# Altium schematic symbol library Regulator_Linear.SchLib: 1452 symbols (part 2 of 10) (continued)
## APE8865Y5-30-HF-3
designator *  value APE8865Y5-30-HF-3
ki_keywords: 300mA LDO Regulator Fixed Positive; ki_description: 300mA Low Dropout Voltage Regulator, Fixed Output 3.0V, SOT-23-5; ki_fp_filters: SOT?23*; Footprint: Package_TO_SOT_SMD:SOT-23-5; Supplier: http://www.tme.eu/fr/Document/ced3461ed31ea70a3c416fb648e0cde7/APE8865-3.pdf
footprint SOT-23-5
pins: 1 VIN (power), 2 GND (power), 3 ~{{SHDN}} (in), 4 BYP (in), 5 VOUT (power)

## APE8865Y5-31-HF-3
designator *  value APE8865Y5-31-HF-3
ki_keywords: 300mA LDO Regulator Fixed Positive; ki_description: 300mA Low Dropout Voltage Regulator, Fixed Output 3.1V, SOT-23-5; ki_fp_filters: SOT?23*; Footprint: Package_TO_SOT_SMD:SOT-23-5; Supplier: http://www.tme.eu/fr/Document/ced3461ed31ea70a3c416fb648e0cde7/APE8865-3.pdf
footprint SOT-23-5
pins: 1 VIN (power), 2 GND (power), 3 ~{{SHDN}} (in), 4 BYP (in), 5 VOUT (power)

## APE8865Y5-32-HF-3
designator *  value APE8865Y5-32-HF-3
ki_keywords: 300mA LDO Regulator Fixed Positive; ki_description: 300mA Low Dropout Voltage Regulator, Fixed Output 3.2V, SOT-23-5; ki_fp_filters: SOT?23*; Footprint: Package_TO_SOT_SMD:SOT-23-5; Supplier: http://www.tme.eu/fr/Document/ced3461ed31ea70a3c416fb648e0cde7/APE8865-3.pdf
footprint SOT-23-5
pins: 1 VIN (power), 2 GND (power), 3 ~{{SHDN}} (in), 4 BYP (in), 5 VOUT (power)

## APE8865Y5-33-HF-3
designator *  value APE8865Y5-33-HF-3
ki_keywords: 300mA LDO Regulator Fixed Positive; ki_description: 300mA Low Dropout Voltage Regulator, Fixed Output 3.3V, SOT-23-5; ki_fp_filters: SOT?23*; Footprint: Package_TO_SOT_SMD:SOT-23-5; Supplier: http://www.tme.eu/fr/Document/ced3461ed31ea70a3c416fb648e0cde7/APE8865-3.pdf
footprint SOT-23-5
pins: 1 VIN (power), 2 GND (power), 3 ~{{SHDN}} (in), 4 BYP (in), 5 VOUT (power)

## AZ1084-1.2
designator *  value AZ1084-1.2
ki_keywords: Fixed Voltage Regulator 5A Positive LDO; ki_description: 5A 12V Fixed LDO Linear Regulator, 1.2V, TO-220/TO-252/TO-263; ki_fp_filters: TO?220* TO?252* TO?263*; Supplier: https://www.diodes.com/assets/Datasheets/AZ1084.pdf
pins: 1 GND (power), 2 VO (power), 3 VI (power)

## AZ1084-1.5
designator *  value AZ1084-1.5
ki_keywords: Fixed Voltage Regulator 5A Positive LDO; ki_description: 5A 12V Fixed LDO Linear Regulator, 1.5V, TO-220/TO-252/TO-263; ki_fp_filters: TO?220* TO?252* TO?263*; Supplier: https://www.diodes.com/assets/Datasheets/AZ1084.pdf
pins: 1 GND (power), 2 VO (power), 3 VI (power)

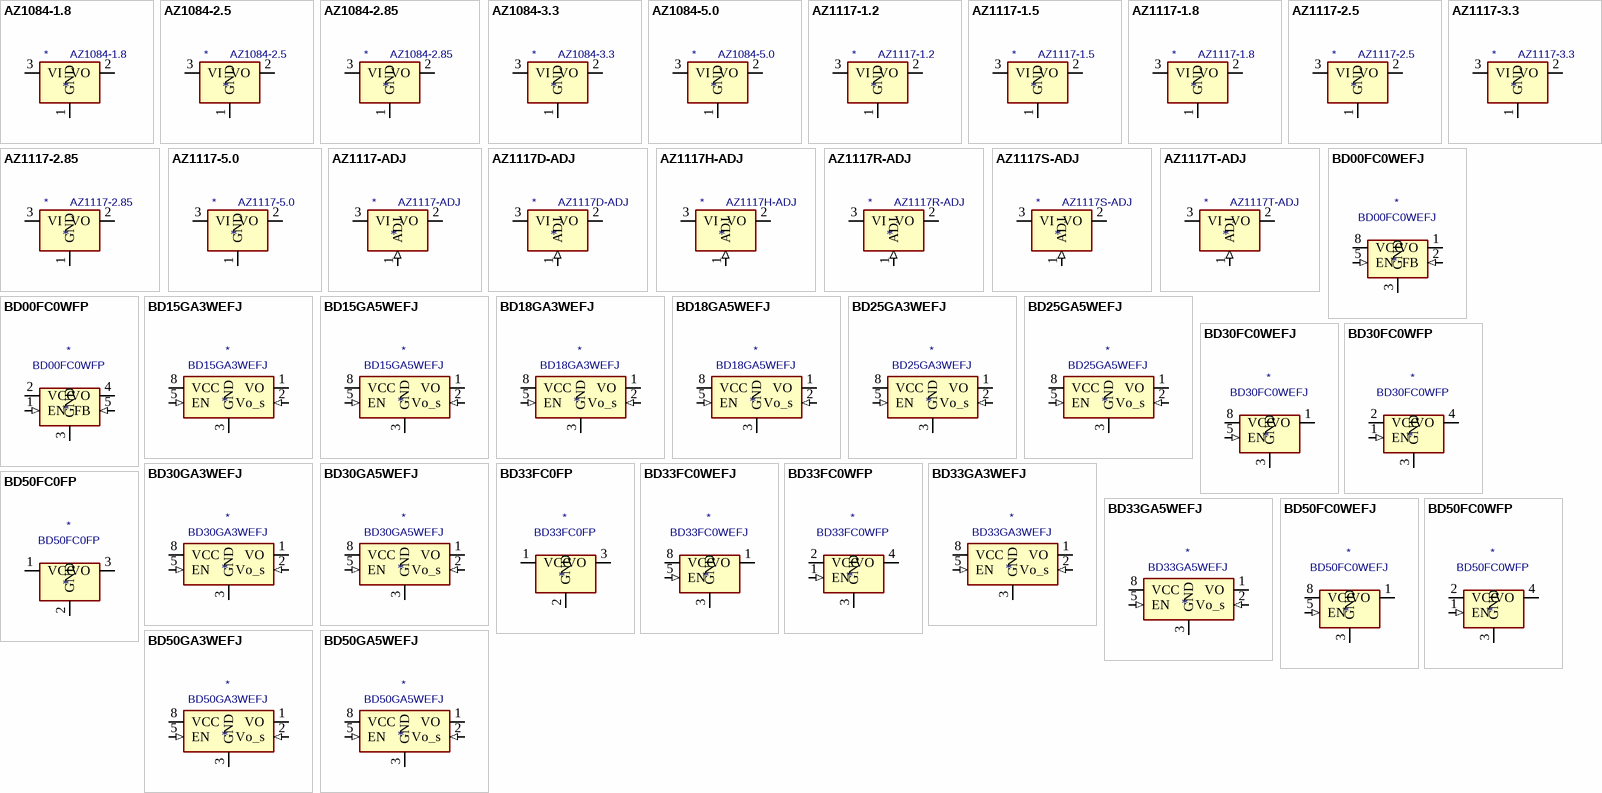
[diagram p6: symbols AZ1084-1.8 to BD50GA5WEFJ]

## AZ1084-1.8
designator *  value AZ1084-1.8
ki_keywords: Fixed Voltage Regulator 5A Positive LDO; ki_description: 5A 12V Fixed LDO Linear Regulator, 1.5V, TO-220/TO-252/TO-263; ki_fp_filters: TO?220* TO?252* TO?263*; Supplier: https://www.diodes.com/assets/Datasheets/AZ1084.pdf
pins: 1 GND (power), 2 VO (power), 3 VI (power)

## AZ1084-2.5
designator *  value AZ1084-2.5
ki_keywords: Fixed Voltage Regulator 5A Positive LDO; ki_description: 5A 12V Fixed LDO Linear Regulator, 1.5V, TO-220/TO-252/TO-263; ki_fp_filters: TO?220* TO?252* TO?263*; Supplier: https://www.diodes.com/assets/Datasheets/AZ1084.pdf
pins: 1 GND (power), 2 VO (power), 3 VI (power)

## AZ1084-2.85
designator *  value AZ1084-2.85
ki_keywords: Fixed Voltage Regulator 5A Positive LDO; ki_description: 5A 12V Fixed LDO Linear Regulator, 1.5V, TO-220/TO-252/TO-263; ki_fp_filters: TO?220* TO?252* TO?263*; Supplier: https://www.diodes.com/assets/Datasheets/AZ1084.pdf
pins: 1 GND (power), 2 VO (power), 3 VI (power)

## AZ1084-3.3
designator *  value AZ1084-3.3
ki_keywords: Fixed Voltage Regulator 5A Positive LDO; ki_description: 5A 12V Fixed LDO Linear Regulator, 1.5V, TO-220/TO-252/TO-263; ki_fp_filters: TO?220* TO?252* TO?263*; Supplier: https://www.diodes.com/assets/Datasheets/AZ1084.pdf
pins: 1 GND (power), 2 VO (power), 3 VI (power)

## AZ1084-5.0
designator *  value AZ1084-5.0
ki_keywords: Fixed Voltage Regulator 5A Positive LDO; ki_description: 5A 12V Fixed LDO Linear Regulator, 1.5V, TO-220/TO-252/TO-263; ki_fp_filters: TO?220* TO?252* TO?263*; Supplier: https://www.diodes.com/assets/Datasheets/AZ1084.pdf
pins: 1 GND (power), 2 VO (power), 3 VI (power)

## AZ1117-1.2
designator *  value AZ1117-1.2
ki_keywords: Fixed Voltage Regulator 1A Positive LDO; ki_description: 1A 20V Fixed LDO Linear Regulator, 1.2V, SOT-89/SOT-223/TO-220/TO-252/TO-263; ki_fp_filters: SOT?223* SOT?89* TO?220* TO?252* TO?263*; Supplier: https://www.diodes.com/assets/Datasheets/AZ1117.pdf
pins: 1 GND (power), 2 VO (power), 3 VI (power)

## AZ1117-1.5
designator *  value AZ1117-1.5
ki_keywords: Fixed Voltage Regulator 1A Positive LDO; ki_description: 1A 20V Fixed LDO Linear Regulator, 1.5V, SOT-89/SOT-223/TO-220/TO-252/TO-263; ki_fp_filters: SOT?223* SOT?89* TO?220* TO?252* TO?263*; Supplier: https://www.diodes.com/assets/Datasheets/AZ1117.pdf
pins: 1 GND (power), 2 VO (power), 3 VI (power)

## AZ1117-1.8
designator *  value AZ1117-1.8
ki_keywords: Fixed Voltage Regulator 1A Positive LDO; ki_description: 1A 20V Fixed LDO Linear Regulator, 1.8V, SOT-89/SOT-223/TO-220/TO-252/TO-263; ki_fp_filters: SOT?223* SOT?89* TO?220* TO?252* TO?263*; Supplier: https://www.diodes.com/assets/Datasheets/AZ1117.pdf
pins: 1 GND (power), 2 VO (power), 3 VI (power)

## AZ1117-2.5
designator *  value AZ1117-2.5
ki_keywords: Fixed Voltage Regulator 1A Positive LDO; ki_description: 1A 20V Fixed LDO Linear Regulator, 2.5V, SOT-89/SOT-223/TO-220/TO-252/TO-263; ki_fp_filters: SOT?223* SOT?89* TO?220* TO?252* TO?263*; Supplier: https://www.diodes.com/assets/Datasheets/AZ1117.pdf
pins: 1 GND (power), 2 VO (power), 3 VI (power)

## AZ1117-2.85
designator *  value AZ1117-2.85
ki_keywords: Fixed Voltage Regulator 1A Positive LDO; ki_description: 1A 20V Fixed LDO Linear Regulator, 2.85V, SOT-89/SOT-223/TO-220/TO-252/TO-263; ki_fp_filters: SOT?223* SOT?89* TO?220* TO?252* TO?263*; Supplier: https://www.diodes.com/assets/Datasheets/AZ1117.pdf
pins: 1 GND (power), 2 VO (power), 3 VI (power)

## AZ1117-3.3
designator *  value AZ1117-3.3
ki_keywords: Fixed Voltage Regulator 1A Positive LDO; ki_description: 1A 20V Fixed LDO Linear Regulator, 3.3V, SOT-89/SOT-223/TO-220/TO-252/TO-263; ki_fp_filters: SOT?223* SOT?89* TO?220* TO?252* TO?263*; Supplier: https://www.diodes.com/assets/Datasheets/AZ1117.pdf
pins: 1 GND (power), 2 VO (power), 3 VI (power)

## AZ1117-5.0
designator *  value AZ1117-5.0
ki_keywords: Fixed Voltage Regulator 1A Positive LDO; ki_description: 1A 20V Fixed LDO Linear Regulator, 5.0V, SOT-89/SOT-223/TO-220/TO-252/TO-263; ki_fp_filters: SOT?223* SOT?89* TO?220* TO?252* TO?263*; Supplier: https://www.diodes.com/assets/Datasheets/AZ1117.pdf
pins: 1 GND (power), 2 VO (power), 3 VI (power)

## AZ1117-ADJ
designator *  value AZ1117-ADJ
ki_keywords: Adjustable Voltage Regulator 1A Positive LDO; ki_description: 1A 20V Adjustable LDO Linear Regulator, SOT-89/SOT-223/TO-220/TO-252/TO-263; ki_fp_filters: SOT?223* SOT?89* TO?220* TO?252* TO?263*; Supplier: https://www.diodes.com/assets/Datasheets/AZ1117.pdf
pins: 1 ADJ (in), 2 VO (power), 3 VI (power)

## AZ1117D-ADJ
designator *  value AZ1117D-ADJ
ki_keywords: Adjustable Voltage Regulator 1A Positive LDO; ki_description: 1A 20V Adjustable LDO Linear Regulator, TO-252; ki_fp_filters: TO?252*; Footprint: Package_TO_SOT_SMD:TO-252-2; Supplier: https://www.diodes.com/assets/Datasheets/products_inactive_data/AZ1117.pdf
footprint TO-252-2
pins: 1 ADJ (in), 2 VO (power), 3 VI (power)

## AZ1117H-ADJ
designator *  value AZ1117H-ADJ
ki_keywords: Adjustable Voltage Regulator 1A Positive LDO; ki_description: 1A 20V Adjustable LDO Linear Regulator, SOT-223; ki_fp_filters: SOT?223*TabPin2*; Footprint: Package_TO_SOT_SMD:SOT-223-3_TabPin2; Supplier: https://www.diodes.com/assets/Datasheets/products_inactive_data/AZ1117.pdf
footprint SOT-223-3_TabPin2
pins: 1 ADJ (in), 2 VO (power), 3 VI (power)

## AZ1117R-ADJ
designator *  value AZ1117R-ADJ
ki_keywords: Adjustable Voltage Regulator 1A Positive LDO; ki_description: 1A 20V Adjustable LDO Linear Regulator, SOT-89; ki_fp_filters: SOT?89*; Footprint: Package_TO_SOT_SMD:SOT-89-3; Supplier: https://www.diodes.com/assets/Datasheets/products_inactive_data/AZ1117.pdf
footprint SOT-89-3
pins: 1 ADJ (in), 2 VO (power), 3 VI (power)

## AZ1117S-ADJ
designator *  value AZ1117S-ADJ
ki_keywords: Adjustable Voltage Regulator 1A Positive LDO; ki_description: 1A 20V Adjustable LDO Linear Regulator, TO-263; ki_fp_filters: TO?263*; Footprint: Package_TO_SOT_SMD:TO-263-2; Supplier: https://www.diodes.com/assets/Datasheets/products_inactive_data/AZ1117.pdf
footprint TO-263-2
pins: 1 ADJ (in), 2 VO (power), 3 VI (power)

## AZ1117T-ADJ
designator *  value AZ1117T-ADJ
ki_keywords: Adjustable Voltage Regulator 1A Positive LDO; ki_description: 1A 20V Adjustable LDO Linear Regulator, TO-220; ki_fp_filters: TO?220*; Footprint: Package_TO_SOT_THT:TO-220-3_Vertical; Supplier: https://www.diodes.com/assets/Datasheets/products_inactive_data/AZ1117.pdf
footprint TO-220-3_Vertical
pins: 1 ADJ (in), 2 VO (power), 3 VI (power)

## BD00FC0WEFJ
designator *  value BD00FC0WEFJ
ki_keywords: linear regulator variable positive over voltage protection thermal shutdown; ki_description: 1A, variable LDO regulator with OVP & TSP, with enable, HTSOP-J8; ki_fp_filters: HTSOP*1EP*3.9x4.9mm*P1.27mm*; Footprint: Package_SO:HTSOP-8-1EP_3.9x4.9mm_P1.27mm_EP2.4x3.2mm; Supplier: https://fscdn.rohm.com/en/products/databook/datasheet/ic/power/linear_regulator/bdxxfc0wefj-e.pdf
footprint HTSOP-8-1EP_3.9x4.9mm_P1.27mm_EP2.4x3.2mm
pins: 1 VO (power), 2 FB (in), 3 GND (power), 4 NC (in) hidden, 5 EN (in), 6 NC (in) hidden, 7 NC (in) hidden, 8 VCC (power), 9 GND hidden

## BD00FC0WFP
designator *  value BD00FC0WFP
ki_keywords: linear regulator variable positive over voltage protection thermal shutdown; ki_description: 1A, variable LDO regulator with OVP & TSP, with enable, TO-252; ki_fp_filters: TO?252*; Footprint: Package_TO_SOT_SMD:TO-252-4; Supplier: https://fscdn.rohm.com/en/products/databook/datasheet/ic/power/linear_regulator/bdxxfc0wefj-e.pdf
footprint TO-252-4
pins: 1 EN (in), 2 VCC (power), 3 GND (power), 4 VO (power), 5 FB (in)

## BD15GA3WEFJ
designator *  value BD15GA3WEFJ
ki_keywords: linear regulator fixed positive over voltage protection thermal shutdown; ki_description: 300mA, 1.5V LDO regulator with OVP & TSP, HTSOP-8; ki_fp_filters: HTSOP*1EP*3.9x4.9mm*P1.27mm*; Footprint: Package_SO:HTSOP-8-1EP_3.9x4.9mm_P1.27mm_EP2.4x3.2mm; Supplier: http://rohmfs.rohm.com/en/products/databook/datasheet/ic/power/linear_regulator/bdxxga3wefj-e.pdf
footprint HTSOP-8-1EP_3.9x4.9mm_P1.27mm_EP2.4x3.2mm
pins: 1 VO (power), 2 Vo_s (in), 3 GND (power), 4 GND hidden, 5 EN (in), 6 GND hidden, 7 GND hidden, 8 VCC (power), 9 GND hidden

## BD15GA5WEFJ
designator *  value BD15GA5WEFJ
ki_keywords: linear regulator fixed positive over voltage protection thermal shutdown; ki_description: 500mA, 1.5V LDO regulator with OVP & TSP, HTSOP-8; ki_fp_filters: HTSOP*1EP*3.9x4.9mm*P1.27mm*; Footprint: Package_SO:HTSOP-8-1EP_3.9x4.9mm_P1.27mm_EP2.4x3.2mm; Supplier: http://rohmfs.rohm.com/en/products/databook/datasheet/ic/power/linear_regulator/bdxxga5wefj-e.pdf
footprint HTSOP-8-1EP_3.9x4.9mm_P1.27mm_EP2.4x3.2mm
pins: 1 VO (power), 2 Vo_s (in), 3 GND (power), 4 GND hidden, 5 EN (in), 6 GND hidden, 7 GND hidden, 8 VCC (power), 9 GND hidden

## BD18GA3WEFJ
designator *  value BD18GA3WEFJ
ki_keywords: linear regulator fixed positive over voltage protection thermal shutdown; ki_description: 300mA, 1.8V LDO regulator with OVP & TSP, HTSOP-8; ki_fp_filters: HTSOP*1EP*3.9x4.9mm*P1.27mm*; Footprint: Package_SO:HTSOP-8-1EP_3.9x4.9mm_P1.27mm_EP2.4x3.2mm; Supplier: http://rohmfs.rohm.com/en/products/databook/datasheet/ic/power/linear_regulator/bdxxga3wefj-e.pdf
footprint HTSOP-8-1EP_3.9x4.9mm_P1.27mm_EP2.4x3.2mm
pins: 1 VO (power), 2 Vo_s (in), 3 GND (power), 4 GND hidden, 5 EN (in), 6 GND hidden, 7 GND hidden, 8 VCC (power), 9 GND hidden

## BD18GA5WEFJ
designator *  value BD18GA5WEFJ
ki_keywords: linear regulator fixed positive over voltage protection thermal shutdown; ki_description: 500mA, 1.8V LDO regulator with OVP & TSP, HTSOP-8; ki_fp_filters: HTSOP*1EP*3.9x4.9mm*P1.27mm*; Footprint: Package_SO:HTSOP-8-1EP_3.9x4.9mm_P1.27mm_EP2.4x3.2mm; Supplier: http://rohmfs.rohm.com/en/products/databook/datasheet/ic/power/linear_regulator/bdxxga5wefj-e.pdf
footprint HTSOP-8-1EP_3.9x4.9mm_P1.27mm_EP2.4x3.2mm
pins: 1 VO (power), 2 Vo_s (in), 3 GND (power), 4 GND hidden, 5 EN (in), 6 GND hidden, 7 GND hidden, 8 VCC (power), 9 GND hidden

## BD25GA3WEFJ
designator *  value BD25GA3WEFJ
ki_keywords: linear regulator fixed positive over voltage protection thermal shutdown; ki_description: 300mA, 2.5V LDO regulator with OVP & TSP, HTSOP-8; ki_fp_filters: HTSOP*1EP*3.9x4.9mm*P1.27mm*; Footprint: Package_SO:HTSOP-8-1EP_3.9x4.9mm_P1.27mm_EP2.4x3.2mm; Supplier: http://rohmfs.rohm.com/en/products/databook/datasheet/ic/power/linear_regulator/bdxxga3wefj-e.pdf
footprint HTSOP-8-1EP_3.9x4.9mm_P1.27mm_EP2.4x3.2mm
pins: 1 VO (power), 2 Vo_s (in), 3 GND (power), 4 GND hidden, 5 EN (in), 6 GND hidden, 7 GND hidden, 8 VCC (power), 9 GND hidden

## BD25GA5WEFJ
designator *  value BD25GA5WEFJ
ki_keywords: linear regulator fixed positive over voltage protection thermal shutdown; ki_description: 500mA, 2.5V LDO regulator with OVP & TSP, HTSOP-8; ki_fp_filters: HTSOP*1EP*3.9x4.9mm*P1.27mm*; Footprint: Package_SO:HTSOP-8-1EP_3.9x4.9mm_P1.27mm_EP2.4x3.2mm; Supplier: http://rohmfs.rohm.com/en/products/databook/datasheet/ic/power/linear_regulator/bdxxga5wefj-e.pdf
footprint HTSOP-8-1EP_3.9x4.9mm_P1.27mm_EP2.4x3.2mm
pins: 1 VO (power), 2 Vo_s (in), 3 GND (power), 4 GND hidden, 5 EN (in), 6 GND hidden, 7 GND hidden, 8 VCC (power), 9 GND hidden

## BD30FC0WEFJ
designator *  value BD30FC0WEFJ
ki_keywords: linear regulator fixed positive over voltage protection thermal shutdown; ki_description: 1A, 3.0V LDO regulator with OVP & TSP, with enable, HTSOP-J8; ki_fp_filters: HTSOP*1EP*3.9x4.9mm*P1.27mm*; Footprint: Package_SO:HTSOP-8-1EP_3.9x4.9mm_P1.27mm_EP2.4x3.2mm; Supplier: https://fscdn.rohm.com/en/products/databook/datasheet/ic/power/linear_regulator/bdxxfc0wefj-e.pdf
footprint HTSOP-8-1EP_3.9x4.9mm_P1.27mm_EP2.4x3.2mm
pins: 1 VO (power), 2 NC (in) hidden, 3 GND (power), 4 NC (in) hidden, 5 EN (in), 6 NC (in) hidden, 7 NC (in) hidden, 8 VCC (power), 9 GND hidden

## BD30FC0WFP
designator *  value BD30FC0WFP
ki_keywords: linear regulator fixed positive over voltage protection thermal shutdown; ki_description: 1A, 3.0V LDO regulator with OVP & TSP, with enable, TO-252; ki_fp_filters: TO?252*; Footprint: Package_TO_SOT_SMD:TO-252-4; Supplier: https://fscdn.rohm.com/en/products/databook/datasheet/ic/power/linear_regulator/bdxxfc0wefj-e.pdf
footprint TO-252-4
pins: 1 EN (in), 2 VCC (power), 3 GND (power), 4 VO (power), 5 NC (in) hidden

## BD30GA3WEFJ
designator *  value BD30GA3WEFJ
ki_keywords: linear regulator fixed positive over voltage protection thermal shutdown; ki_description: 300mA, 3V LDO regulator with OVP & TSP, HTSOP-8; ki_fp_filters: HTSOP*1EP*3.9x4.9mm*P1.27mm*; Footprint: Package_SO:HTSOP-8-1EP_3.9x4.9mm_P1.27mm_EP2.4x3.2mm; Supplier: http://rohmfs.rohm.com/en/products/databook/datasheet/ic/power/linear_regulator/bdxxga3wefj-e.pdf
footprint HTSOP-8-1EP_3.9x4.9mm_P1.27mm_EP2.4x3.2mm
pins: 1 VO (power), 2 Vo_s (in), 3 GND (power), 4 GND hidden, 5 EN (in), 6 GND hidden, 7 GND hidden, 8 VCC (power), 9 GND hidden

## BD30GA5WEFJ
designator *  value BD30GA5WEFJ
ki_keywords: linear regulator fixed positive over voltage protection thermal shutdown; ki_description: 500mA, 3V LDO regulator with OVP & TSP, HTSOP-8; ki_fp_filters: HTSOP*1EP*3.9x4.9mm*P1.27mm*; Footprint: Package_SO:HTSOP-8-1EP_3.9x4.9mm_P1.27mm_EP2.4x3.2mm; Supplier: http://rohmfs.rohm.com/en/products/databook/datasheet/ic/power/linear_regulator/bdxxga5wefj-e.pdf
footprint HTSOP-8-1EP_3.9x4.9mm_P1.27mm_EP2.4x3.2mm
pins: 1 VO (power), 2 Vo_s (in), 3 GND (power), 4 GND hidden, 5 EN (in), 6 GND hidden, 7 GND hidden, 8 VCC (power), 9 GND hidden

## BD33FC0FP
designator *  value BD33FC0FP
ki_keywords: linear regulator fixed positive over voltage protection thermal shutdown; ki_description: 1A, 3.3V LDO regulator with OVP & TSP, without enable, TO-252; ki_fp_filters: TO?252*; Footprint: Package_TO_SOT_SMD:TO-252-2; Supplier: https://fscdn.rohm.com/en/products/databook/datasheet/ic/power/linear_regulator/bdxxfc0wefj-e.pdf
footprint TO-252-2
pins: 1 VCC (power), 2 GND (power), 3 VO (power)

## BD33FC0WEFJ
designator *  value BD33FC0WEFJ
ki_keywords: linear regulator fixed positive over voltage protection thermal shutdown; ki_description: 1A, 3.3V LDO regulator with OVP & TSP, with enable, HTSOP-J8; ki_fp_filters: HTSOP*1EP*3.9x4.9mm*P1.27mm*; Footprint: Package_SO:HTSOP-8-1EP_3.9x4.9mm_P1.27mm_EP2.4x3.2mm; Supplier: https://fscdn.rohm.com/en/products/databook/datasheet/ic/power/linear_regulator/bdxxfc0wefj-e.pdf
footprint HTSOP-8-1EP_3.9x4.9mm_P1.27mm_EP2.4x3.2mm
pins: 1 VO (power), 2 NC (in) hidden, 3 GND (power), 4 NC (in) hidden, 5 EN (in), 6 NC (in) hidden, 7 NC (in) hidden, 8 VCC (power), 9 GND hidden

## BD33FC0WFP
designator *  value BD33FC0WFP
ki_keywords: linear regulator fixed positive over voltage protection thermal shutdown; ki_description: 1A, 3.3V LDO regulator with OVP & TSP, with enable, TO-252; ki_fp_filters: TO?252*; Footprint: Package_TO_SOT_SMD:TO-252-4; Supplier: https://fscdn.rohm.com/en/products/databook/datasheet/ic/power/linear_regulator/bdxxfc0wefj-e.pdf
footprint TO-252-4
pins: 1 EN (in), 2 VCC (power), 3 GND (power), 4 VO (power), 5 NC (in) hidden

## BD33GA3WEFJ
designator *  value BD33GA3WEFJ
ki_keywords: linear regulator fixed positive over voltage protection thermal shutdown; ki_description: 300mA, 3.3V LDO regulator with OVP & TSP, HTSOP-8; ki_fp_filters: HTSOP*1EP*3.9x4.9mm*P1.27mm*; Footprint: Package_SO:HTSOP-8-1EP_3.9x4.9mm_P1.27mm_EP2.4x3.2mm; Supplier: http://rohmfs.rohm.com/en/products/databook/datasheet/ic/power/linear_regulator/bdxxga3wefj-e.pdf
footprint HTSOP-8-1EP_3.9x4.9mm_P1.27mm_EP2.4x3.2mm
pins: 1 VO (power), 2 Vo_s (in), 3 GND (power), 4 GND hidden, 5 EN (in), 6 GND hidden, 7 GND hidden, 8 VCC (power), 9 GND hidden

## BD33GA5WEFJ
designator *  value BD33GA5WEFJ
ki_keywords: linear regulator fixed positive over voltage protection thermal shutdown; ki_description: 500mA, 3.3V LDO regulator with OVP & TSP, HTSOP-8; ki_fp_filters: HTSOP*1EP*3.9x4.9mm*P1.27mm*; Footprint: Package_SO:HTSOP-8-1EP_3.9x4.9mm_P1.27mm_EP2.4x3.2mm; Supplier: http://rohmfs.rohm.com/en/products/databook/datasheet/ic/power/linear_regulator/bdxxga5wefj-e.pdf
footprint HTSOP-8-1EP_3.9x4.9mm_P1.27mm_EP2.4x3.2mm
pins: 1 VO (power), 2 Vo_s (in), 3 GND (power), 4 GND hidden, 5 EN (in), 6 GND hidden, 7 GND hidden, 8 VCC (power), 9 GND hidden

## BD50FC0FP
designator *  value BD50FC0FP
ki_keywords: linear regulator fixed positive over voltage protection thermal shutdown; ki_description: 1A, 5.0V LDO regulator with OVP & TSP, without enable, TO-252; ki_fp_filters: TO?252*; Footprint: Package_TO_SOT_SMD:TO-252-2; Supplier: https://fscdn.rohm.com/en/products/databook/datasheet/ic/power/linear_regulator/bdxxfc0wefj-e.pdf
footprint TO-252-2
pins: 1 VCC (power), 2 GND (power), 3 VO (power)

## BD50FC0WEFJ
designator *  value BD50FC0WEFJ
ki_keywords: linear regulator fixed positive over voltage protection thermal shutdown; ki_description: 1A, 5.0V LDO regulator with OVP & TSP, with enable, HTSOP-J8; ki_fp_filters: HTSOP*1EP*3.9x4.9mm*P1.27mm*; Footprint: Package_SO:HTSOP-8-1EP_3.9x4.9mm_P1.27mm_EP2.4x3.2mm; Supplier: https://fscdn.rohm.com/en/products/databook/datasheet/ic/power/linear_regulator/bdxxfc0wefj-e.pdf
footprint HTSOP-8-1EP_3.9x4.9mm_P1.27mm_EP2.4x3.2mm
pins: 1 VO (power), 2 NC (in) hidden, 3 GND (power), 4 NC (in) hidden, 5 EN (in), 6 NC (in) hidden, 7 NC (in) hidden, 8 VCC (power), 9 GND hidden

## BD50FC0WFP
designator *  value BD50FC0WFP
ki_keywords: linear regulator fixed positive over voltage protection thermal shutdown; ki_description: 1A, 5.0V LDO regulator with OVP & TSP, with enable, TO-252; ki_fp_filters: TO?252*; Footprint: Package_TO_SOT_SMD:TO-252-4; Supplier: https://fscdn.rohm.com/en/products/databook/datasheet/ic/power/linear_regulator/bdxxfc0wefj-e.pdf
footprint TO-252-4
pins: 1 EN (in), 2 VCC (power), 3 GND (power), 4 VO (power), 5 NC (in) hidden

## BD50GA3WEFJ
designator *  value BD50GA3WEFJ
ki_keywords: linear regulator fixed positive over voltage protection thermal shutdown; ki_description: 300mA, 5V LDO regulator with OVP & TSP, HTSOP-8; ki_fp_filters: HTSOP*1EP*3.9x4.9mm*P1.27mm*; Footprint: Package_SO:HTSOP-8-1EP_3.9x4.9mm_P1.27mm_EP2.4x3.2mm; Supplier: http://rohmfs.rohm.com/en/products/databook/datasheet/ic/power/linear_regulator/bdxxga3wefj-e.pdf
footprint HTSOP-8-1EP_3.9x4.9mm_P1.27mm_EP2.4x3.2mm
pins: 1 VO (power), 2 Vo_s (in), 3 GND (power), 4 GND hidden, 5 EN (in), 6 GND hidden, 7 GND hidden, 8 VCC (power), 9 GND hidden

## BD50GA5WEFJ
designator *  value BD50GA5WEFJ
ki_keywords: linear regulator fixed positive over voltage protection thermal shutdown; ki_description: 500mA, 5V LDO regulator with OVP & TSP, HTSOP-8; ki_fp_filters: HTSOP*1EP*3.9x4.9mm*P1.27mm*; Footprint: Package_SO:HTSOP-8-1EP_3.9x4.9mm_P1.27mm_EP2.4x3.2mm; Supplier: http://rohmfs.rohm.com/en/products/databook/datasheet/ic/power/linear_regulator/bdxxga5wefj-e.pdf
footprint HTSOP-8-1EP_3.9x4.9mm_P1.27mm_EP2.4x3.2mm
pins: 1 VO (power), 2 Vo_s (in), 3 GND (power), 4 GND hidden, 5 EN (in), 6 GND hidden, 7 GND hidden, 8 VCC (power), 9 GND hidden

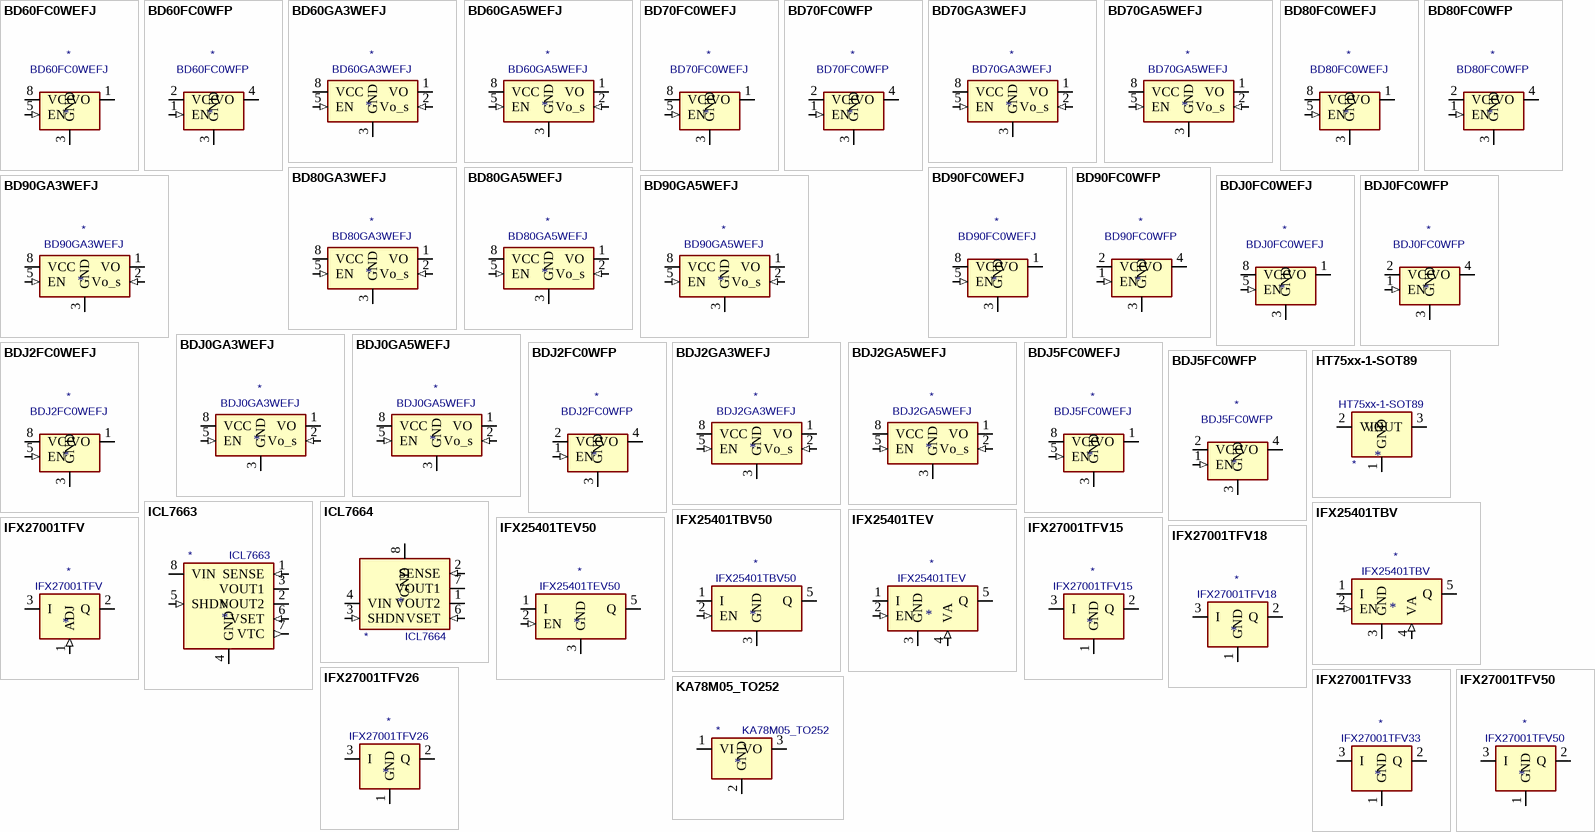
[diagram p7: symbols BD60FC0WEFJ to KA78M05_TO252]

## BD60FC0WEFJ
designator *  value BD60FC0WEFJ
ki_keywords: linear regulator fixed positive over voltage protection thermal shutdown; ki_description: 1A, 6.0V LDO regulator with OVP & TSP, with enable, HTSOP-J8; ki_fp_filters: HTSOP*1EP*3.9x4.9mm*P1.27mm*; Footprint: Package_SO:HTSOP-8-1EP_3.9x4.9mm_P1.27mm_EP2.4x3.2mm; Supplier: https://fscdn.rohm.com/en/products/databook/datasheet/ic/power/linear_regulator/bdxxfc0wefj-e.pdf
footprint HTSOP-8-1EP_3.9x4.9mm_P1.27mm_EP2.4x3.2mm
pins: 1 VO (power), 2 NC (in) hidden, 3 GND (power), 4 NC (in) hidden, 5 EN (in), 6 NC (in) hidden, 7 NC (in) hidden, 8 VCC (power), 9 GND hidden

## BD60FC0WFP
designator *  value BD60FC0WFP
ki_keywords: linear regulator fixed positive over voltage protection thermal shutdown; ki_description: 1A, 6.0V LDO regulator with OVP & TSP, with enable, TO-252; ki_fp_filters: TO?252*; Footprint: Package_TO_SOT_SMD:TO-252-4; Supplier: https://fscdn.rohm.com/en/products/databook/datasheet/ic/power/linear_regulator/bdxxfc0wefj-e.pdf
footprint TO-252-4
pins: 1 EN (in), 2 VCC (power), 3 GND (power), 4 VO (power), 5 NC (in) hidden

## BD60GA3WEFJ
designator *  value BD60GA3WEFJ
ki_keywords: linear regulator fixed positive over voltage protection thermal shutdown; ki_description: 300mA, 6V LDO regulator with OVP & TSP, HTSOP-8; ki_fp_filters: HTSOP*1EP*3.9x4.9mm*P1.27mm*; Footprint: Package_SO:HTSOP-8-1EP_3.9x4.9mm_P1.27mm_EP2.4x3.2mm; Supplier: http://rohmfs.rohm.com/en/products/databook/datasheet/ic/power/linear_regulator/bdxxga3wefj-e.pdf
footprint HTSOP-8-1EP_3.9x4.9mm_P1.27mm_EP2.4x3.2mm
pins: 1 VO (power), 2 Vo_s (in), 3 GND (power), 4 GND hidden, 5 EN (in), 6 GND hidden, 7 GND hidden, 8 VCC (power), 9 GND hidden

## BD60GA5WEFJ
designator *  value BD60GA5WEFJ
ki_keywords: linear regulator fixed positive over voltage protection thermal shutdown; ki_description: 500mA, 6V LDO regulator with OVP & TSP, HTSOP-8; ki_fp_filters: HTSOP*1EP*3.9x4.9mm*P1.27mm*; Footprint: Package_SO:HTSOP-8-1EP_3.9x4.9mm_P1.27mm_EP2.4x3.2mm; Supplier: http://rohmfs.rohm.com/en/products/databook/datasheet/ic/power/linear_regulator/bdxxga5wefj-e.pdf
footprint HTSOP-8-1EP_3.9x4.9mm_P1.27mm_EP2.4x3.2mm
pins: 1 VO (power), 2 Vo_s (in), 3 GND (power), 4 GND hidden, 5 EN (in), 6 GND hidden, 7 GND hidden, 8 VCC (power), 9 GND hidden

## BD70FC0WEFJ
designator *  value BD70FC0WEFJ
ki_keywords: linear regulator fixed positive over voltage protection thermal shutdown; ki_description: 1A, 7.0V LDO regulator with OVP & TSP, with enable, HTSOP-J8; ki_fp_filters: HTSOP*1EP*3.9x4.9mm*P1.27mm*; Footprint: Package_SO:HTSOP-8-1EP_3.9x4.9mm_P1.27mm_EP2.4x3.2mm; Supplier: https://fscdn.rohm.com/en/products/databook/datasheet/ic/power/linear_regulator/bdxxfc0wefj-e.pdf
footprint HTSOP-8-1EP_3.9x4.9mm_P1.27mm_EP2.4x3.2mm
pins: 1 VO (power), 2 NC (in) hidden, 3 GND (power), 4 NC (in) hidden, 5 EN (in), 6 NC (in) hidden, 7 NC (in) hidden, 8 VCC (power), 9 GND hidden

## BD70FC0WFP
designator *  value BD70FC0WFP
ki_keywords: linear regulator fixed positive over voltage protection thermal shutdown; ki_description: 1A, 7.0V LDO regulator with OVP & TSP, with enable, TO-252; ki_fp_filters: TO?252*; Footprint: Package_TO_SOT_SMD:TO-252-4; Supplier: https://fscdn.rohm.com/en/products/databook/datasheet/ic/power/linear_regulator/bdxxfc0wefj-e.pdf
footprint TO-252-4
pins: 1 EN (in), 2 VCC (power), 3 GND (power), 4 VO (power), 5 NC (in) hidden

## BD70GA3WEFJ
designator *  value BD70GA3WEFJ
ki_keywords: linear regulator fixed positive over voltage protection thermal shutdown; ki_description: 300mA, 7V LDO regulator with OVP & TSP, HTSOP-8; ki_fp_filters: HTSOP*1EP*3.9x4.9mm*P1.27mm*; Footprint: Package_SO:HTSOP-8-1EP_3.9x4.9mm_P1.27mm_EP2.4x3.2mm; Supplier: http://rohmfs.rohm.com/en/products/databook/datasheet/ic/power/linear_regulator/bdxxga3wefj-e.pdf
footprint HTSOP-8-1EP_3.9x4.9mm_P1.27mm_EP2.4x3.2mm
pins: 1 VO (power), 2 Vo_s (in), 3 GND (power), 4 GND hidden, 5 EN (in), 6 GND hidden, 7 GND hidden, 8 VCC (power), 9 GND hidden

## BD70GA5WEFJ
designator *  value BD70GA5WEFJ
ki_keywords: linear regulator fixed positive over voltage protection thermal shutdown; ki_description: 500mA, 7V LDO regulator with OVP & TSP, HTSOP-8; ki_fp_filters: HTSOP*1EP*3.9x4.9mm*P1.27mm*; Footprint: Package_SO:HTSOP-8-1EP_3.9x4.9mm_P1.27mm_EP2.4x3.2mm; Supplier: http://rohmfs.rohm.com/en/products/databook/datasheet/ic/power/linear_regulator/bdxxga5wefj-e.pdf
footprint HTSOP-8-1EP_3.9x4.9mm_P1.27mm_EP2.4x3.2mm
pins: 1 VO (power), 2 Vo_s (in), 3 GND (power), 4 GND hidden, 5 EN (in), 6 GND hidden, 7 GND hidden, 8 VCC (power), 9 GND hidden

## BD80FC0WEFJ
designator *  value BD80FC0WEFJ
ki_keywords: linear regulator fixed positive over voltage protection thermal shutdown; ki_description: 1A, 8.0V LDO regulator with OVP & TSP, with enable, HTSOP-J8; ki_fp_filters: HTSOP*1EP*3.9x4.9mm*P1.27mm*; Footprint: Package_SO:HTSOP-8-1EP_3.9x4.9mm_P1.27mm_EP2.4x3.2mm; Supplier: https://fscdn.rohm.com/en/products/databook/datasheet/ic/power/linear_regulator/bdxxfc0wefj-e.pdf
footprint HTSOP-8-1EP_3.9x4.9mm_P1.27mm_EP2.4x3.2mm
pins: 1 VO (power), 2 NC (in) hidden, 3 GND (power), 4 NC (in) hidden, 5 EN (in), 6 NC (in) hidden, 7 NC (in) hidden, 8 VCC (power), 9 GND hidden

## BD80FC0WFP
designator *  value BD80FC0WFP
ki_keywords: linear regulator fixed positive over voltage protection thermal shutdown; ki_description: 1A, 8.0V LDO regulator with OVP & TSP, with enable, TO-252; ki_fp_filters: TO?252*; Footprint: Package_TO_SOT_SMD:TO-252-4; Supplier: https://fscdn.rohm.com/en/products/databook/datasheet/ic/power/linear_regulator/bdxxfc0wefj-e.pdf
footprint TO-252-4
pins: 1 EN (in), 2 VCC (power), 3 GND (power), 4 VO (power), 5 NC (in) hidden

## BD80GA3WEFJ
designator *  value BD80GA3WEFJ
ki_keywords: linear regulator fixed positive over voltage protection thermal shutdown; ki_description: 300mA, 8V LDO regulator with OVP & TSP, HTSOP-8; ki_fp_filters: HTSOP*1EP*3.9x4.9mm*P1.27mm*; Footprint: Package_SO:HTSOP-8-1EP_3.9x4.9mm_P1.27mm_EP2.4x3.2mm; Supplier: http://rohmfs.rohm.com/en/products/databook/datasheet/ic/power/linear_regulator/bdxxga3wefj-e.pdf
footprint HTSOP-8-1EP_3.9x4.9mm_P1.27mm_EP2.4x3.2mm
pins: 1 VO (power), 2 Vo_s (in), 3 GND (power), 4 GND hidden, 5 EN (in), 6 GND hidden, 7 GND hidden, 8 VCC (power), 9 GND hidden

## BD80GA5WEFJ
designator *  value BD80GA5WEFJ
ki_keywords: linear regulator fixed positive over voltage protection thermal shutdown; ki_description: 500mA, 8V LDO regulator with OVP & TSP, HTSOP-8; ki_fp_filters: HTSOP*1EP*3.9x4.9mm*P1.27mm*; Footprint: Package_SO:HTSOP-8-1EP_3.9x4.9mm_P1.27mm_EP2.4x3.2mm; Supplier: http://rohmfs.rohm.com/en/products/databook/datasheet/ic/power/linear_regulator/bdxxga5wefj-e.pdf
footprint HTSOP-8-1EP_3.9x4.9mm_P1.27mm_EP2.4x3.2mm
pins: 1 VO (power), 2 Vo_s (in), 3 GND (power), 4 GND hidden, 5 EN (in), 6 GND hidden, 7 GND hidden, 8 VCC (power), 9 GND hidden

## BD90FC0WEFJ
designator *  value BD90FC0WEFJ
ki_keywords: linear regulator fixed positive over voltage protection thermal shutdown; ki_description: 1A, 9.0V LDO regulator with OVP & TSP, with enable, HTSOP-J8; ki_fp_filters: HTSOP*1EP*3.9x4.9mm*P1.27mm*; Footprint: Package_SO:HTSOP-8-1EP_3.9x4.9mm_P1.27mm_EP2.4x3.2mm; Supplier: https://fscdn.rohm.com/en/products/databook/datasheet/ic/power/linear_regulator/bdxxfc0wefj-e.pdf
footprint HTSOP-8-1EP_3.9x4.9mm_P1.27mm_EP2.4x3.2mm
pins: 1 VO (power), 2 NC (in) hidden, 3 GND (power), 4 NC (in) hidden, 5 EN (in), 6 NC (in) hidden, 7 NC (in) hidden, 8 VCC (power), 9 GND hidden

## BD90FC0WFP
designator *  value BD90FC0WFP
ki_keywords: linear regulator fixed positive over voltage protection thermal shutdown; ki_description: 1A, 9.0V LDO regulator with OVP & TSP, with enable, TO-252; ki_fp_filters: TO?252*; Footprint: Package_TO_SOT_SMD:TO-252-4; Supplier: https://fscdn.rohm.com/en/products/databook/datasheet/ic/power/linear_regulator/bdxxfc0wefj-e.pdf
footprint TO-252-4
pins: 1 EN (in), 2 VCC (power), 3 GND (power), 4 VO (power), 5 NC (in) hidden

## BD90GA3WEFJ
designator *  value BD90GA3WEFJ
ki_keywords: linear regulator fixed positive over voltage protection thermal shutdown; ki_description: 300mA, 9V LDO regulator with OVP & TSP, HTSOP-8; ki_fp_filters: HTSOP*1EP*3.9x4.9mm*P1.27mm*; Footprint: Package_SO:HTSOP-8-1EP_3.9x4.9mm_P1.27mm_EP2.4x3.2mm; Supplier: http://rohmfs.rohm.com/en/products/databook/datasheet/ic/power/linear_regulator/bdxxga3wefj-e.pdf
footprint HTSOP-8-1EP_3.9x4.9mm_P1.27mm_EP2.4x3.2mm
pins: 1 VO (power), 2 Vo_s (in), 3 GND (power), 4 GND hidden, 5 EN (in), 6 GND hidden, 7 GND hidden, 8 VCC (power), 9 GND hidden

## BD90GA5WEFJ
designator *  value BD90GA5WEFJ
ki_keywords: linear regulator fixed positive over voltage protection thermal shutdown; ki_description: 500mA, 9V LDO regulator with OVP & TSP, HTSOP-8; ki_fp_filters: HTSOP*1EP*3.9x4.9mm*P1.27mm*; Footprint: Package_SO:HTSOP-8-1EP_3.9x4.9mm_P1.27mm_EP2.4x3.2mm; Supplier: http://rohmfs.rohm.com/en/products/databook/datasheet/ic/power/linear_regulator/bdxxga5wefj-e.pdf
footprint HTSOP-8-1EP_3.9x4.9mm_P1.27mm_EP2.4x3.2mm
pins: 1 VO (power), 2 Vo_s (in), 3 GND (power), 4 GND hidden, 5 EN (in), 6 GND hidden, 7 GND hidden, 8 VCC (power), 9 GND hidden

## BDJ0FC0WEFJ
designator *  value BDJ0FC0WEFJ
ki_keywords: linear regulator fixed positive over voltage protection thermal shutdown; ki_description: 1A, 10.0V LDO regulator with OVP & TSP, with enable, HTSOP-J8; ki_fp_filters: HTSOP*1EP*3.9x4.9mm*P1.27mm*; Footprint: Package_SO:HTSOP-8-1EP_3.9x4.9mm_P1.27mm_EP2.4x3.2mm; Supplier: https://fscdn.rohm.com/en/products/databook/datasheet/ic/power/linear_regulator/bdxxfc0wefj-e.pdf
footprint HTSOP-8-1EP_3.9x4.9mm_P1.27mm_EP2.4x3.2mm
pins: 1 VO (power), 2 NC (in) hidden, 3 GND (power), 4 NC (in) hidden, 5 EN (in), 6 NC (in) hidden, 7 NC (in) hidden, 8 VCC (power), 9 GND hidden

## BDJ0FC0WFP
designator *  value BDJ0FC0WFP
ki_keywords: linear regulator fixed positive over voltage protection thermal shutdown; ki_description: 1A, 10.0V LDO regulator with OVP & TSP, with enable, TO-252; ki_fp_filters: TO?252*; Footprint: Package_TO_SOT_SMD:TO-252-4; Supplier: https://fscdn.rohm.com/en/products/databook/datasheet/ic/power/linear_regulator/bdxxfc0wefj-e.pdf
footprint TO-252-4
pins: 1 EN (in), 2 VCC (power), 3 GND (power), 4 VO (power), 5 NC (in) hidden

## BDJ0GA3WEFJ
designator *  value BDJ0GA3WEFJ
ki_keywords: linear regulator fixed positive over voltage protection thermal shutdown; ki_description: 300mA, 10V LDO regulator with OVP & TSP, HTSOP-8; ki_fp_filters: HTSOP*1EP*3.9x4.9mm*P1.27mm*; Footprint: Package_SO:HTSOP-8-1EP_3.9x4.9mm_P1.27mm_EP2.4x3.2mm; Supplier: http://rohmfs.rohm.com/en/products/databook/datasheet/ic/power/linear_regulator/bdxxga3wefj-e.pdf
footprint HTSOP-8-1EP_3.9x4.9mm_P1.27mm_EP2.4x3.2mm
pins: 1 VO (power), 2 Vo_s (in), 3 GND (power), 4 GND hidden, 5 EN (in), 6 GND hidden, 7 GND hidden, 8 VCC (power), 9 GND hidden

## BDJ0GA5WEFJ
designator *  value BDJ0GA5WEFJ
ki_keywords: linear regulator fixed positive over voltage protection thermal shutdown; ki_description: 500mA, 10V LDO regulator with OVP & TSP, HTSOP-8; ki_fp_filters: HTSOP*1EP*3.9x4.9mm*P1.27mm*; Footprint: Package_SO:HTSOP-8-1EP_3.9x4.9mm_P1.27mm_EP2.4x3.2mm; Supplier: http://rohmfs.rohm.com/en/products/databook/datasheet/ic/power/linear_regulator/bdxxga5wefj-e.pdf
footprint HTSOP-8-1EP_3.9x4.9mm_P1.27mm_EP2.4x3.2mm
pins: 1 VO (power), 2 Vo_s (in), 3 GND (power), 4 GND hidden, 5 EN (in), 6 GND hidden, 7 GND hidden, 8 VCC (power), 9 GND hidden

## BDJ2FC0WEFJ
designator *  value BDJ2FC0WEFJ
ki_keywords: linear regulator fixed positive over voltage protection thermal shutdown; ki_description: 1A, 12.0V LDO regulator with OVP & TSP, with enable, HTSOP-J8; ki_fp_filters: HTSOP*1EP*3.9x4.9mm*P1.27mm*; Footprint: Package_SO:HTSOP-8-1EP_3.9x4.9mm_P1.27mm_EP2.4x3.2mm; Supplier: https://fscdn.rohm.com/en/products/databook/datasheet/ic/power/linear_regulator/bdxxfc0wefj-e.pdf
footprint HTSOP-8-1EP_3.9x4.9mm_P1.27mm_EP2.4x3.2mm
pins: 1 VO (power), 2 NC (in) hidden, 3 GND (power), 4 NC (in) hidden, 5 EN (in), 6 NC (in) hidden, 7 NC (in) hidden, 8 VCC (power), 9 GND hidden

## BDJ2FC0WFP
designator *  value BDJ2FC0WFP
ki_keywords: linear regulator fixed positive over voltage protection thermal shutdown; ki_description: 1A, 12.0V LDO regulator with OVP & TSP, with enable, TO-252; ki_fp_filters: TO?252*; Footprint: Package_TO_SOT_SMD:TO-252-4; Supplier: https://fscdn.rohm.com/en/products/databook/datasheet/ic/power/linear_regulator/bdxxfc0wefj-e.pdf
footprint TO-252-4
pins: 1 EN (in), 2 VCC (power), 3 GND (power), 4 VO (power), 5 NC (in) hidden

## BDJ2GA3WEFJ
designator *  value BDJ2GA3WEFJ
ki_keywords: linear regulator fixed positive over voltage protection thermal shutdown; ki_description: 300mA, 12V LDO regulator with OVP & TSP, HTSOP-8; ki_fp_filters: HTSOP*1EP*3.9x4.9mm*P1.27mm*; Footprint: Package_SO:HTSOP-8-1EP_3.9x4.9mm_P1.27mm_EP2.4x3.2mm; Supplier: http://rohmfs.rohm.com/en/products/databook/datasheet/ic/power/linear_regulator/bdxxga3wefj-e.pdf
footprint HTSOP-8-1EP_3.9x4.9mm_P1.27mm_EP2.4x3.2mm
pins: 1 VO (power), 2 Vo_s (in), 3 GND (power), 4 GND hidden, 5 EN (in), 6 GND hidden, 7 GND hidden, 8 VCC (power), 9 GND hidden

## BDJ2GA5WEFJ
designator *  value BDJ2GA5WEFJ
ki_keywords: linear regulator fixed positive over voltage protection thermal shutdown; ki_description: 500mA, 12V LDO regulator with OVP & TSP, HTSOP-8; ki_fp_filters: HTSOP*1EP*3.9x4.9mm*P1.27mm*; Footprint: Package_SO:HTSOP-8-1EP_3.9x4.9mm_P1.27mm_EP2.4x3.2mm; Supplier: http://rohmfs.rohm.com/en/products/databook/datasheet/ic/power/linear_regulator/bdxxga5wefj-e.pdf
footprint HTSOP-8-1EP_3.9x4.9mm_P1.27mm_EP2.4x3.2mm
pins: 1 VO (power), 2 Vo_s (in), 3 GND (power), 4 GND hidden, 5 EN (in), 6 GND hidden, 7 GND hidden, 8 VCC (power), 9 GND hidden

## BDJ5FC0WEFJ
designator *  value BDJ5FC0WEFJ
ki_keywords: linear regulator fixed positive over voltage protection thermal shutdown; ki_description: 1A, 15.0V LDO regulator with OVP & TSP, with enable, HTSOP-J8; ki_fp_filters: HTSOP*1EP*3.9x4.9mm*P1.27mm*; Footprint: Package_SO:HTSOP-8-1EP_3.9x4.9mm_P1.27mm_EP2.4x3.2mm; Supplier: https://fscdn.rohm.com/en/products/databook/datasheet/ic/power/linear_regulator/bdxxfc0wefj-e.pdf
footprint HTSOP-8-1EP_3.9x4.9mm_P1.27mm_EP2.4x3.2mm
pins: 1 VO (power), 2 NC (in) hidden, 3 GND (power), 4 NC (in) hidden, 5 EN (in), 6 NC (in) hidden, 7 NC (in) hidden, 8 VCC (power), 9 GND hidden

## BDJ5FC0WFP
designator *  value BDJ5FC0WFP
ki_keywords: linear regulator fixed positive over voltage protection thermal shutdown; ki_description: 1A, 15.0V LDO regulator with OVP & TSP, with enable, TO-252; ki_fp_filters: TO?252*; Footprint: Package_TO_SOT_SMD:TO-252-4; Supplier: https://fscdn.rohm.com/en/products/databook/datasheet/ic/power/linear_regulator/bdxxfc0wefj-e.pdf
footprint TO-252-4
pins: 1 EN (in), 2 VCC (power), 3 GND (power), 4 VO (power), 5 NC (in) hidden

## HT75xx-1-SOT89
designator *  value HT75xx-1-SOT89
ki_keywords: 100mA LDO Regulator Fixed Positive; ki_description: 100mA Low Dropout Voltage Regulator, Fixed Output, SOT89; ki_fp_filters: SOT?89*; Footprint: Package_TO_SOT_SMD:SOT-89-3; Supplier: https://www.holtek.com/documents/10179/116711/HT75xx-1v250.pdf
footprint SOT-89-3
pins: 1 GND (power), 2 VIN (power), 3 VOUT (power)

## ICL7663
designator *  value ICL7663
ki_keywords: Linear Regulator 50mA 5V fixed; ki_description: 50mA 5V/Programmable Voltage Regulator, DIP-8/SO-8/TO-99; ki_fp_filters: DIP*W7.62mm* SOIC*3.9x4.9mm*P1.27mm* TO?99*; Supplier: https://datasheets.maximintegrated.com/en/ds/ICL7663.pdf
pins: 1 SENSE (in), 2 VOUT2 (power), 3 VOUT1 (power), 4 GND (power), 5 SHDN (in), 6 VSET (in), 7 VTC (out), 8 VIN (power)